# Altium footprint library ST封装.PcbLib: 1336 footprints (part 100 of 109)
Each footprint in its own frame and in the unit in brackets; x right, y up, seen from the top. Pads: shape width x height; smd on the part's side, far side on the other; paste and mask are expansions set on the pad; w line width, h text height; cw(c..) or ccw(c..) is an arc to the next point about the centre after c.
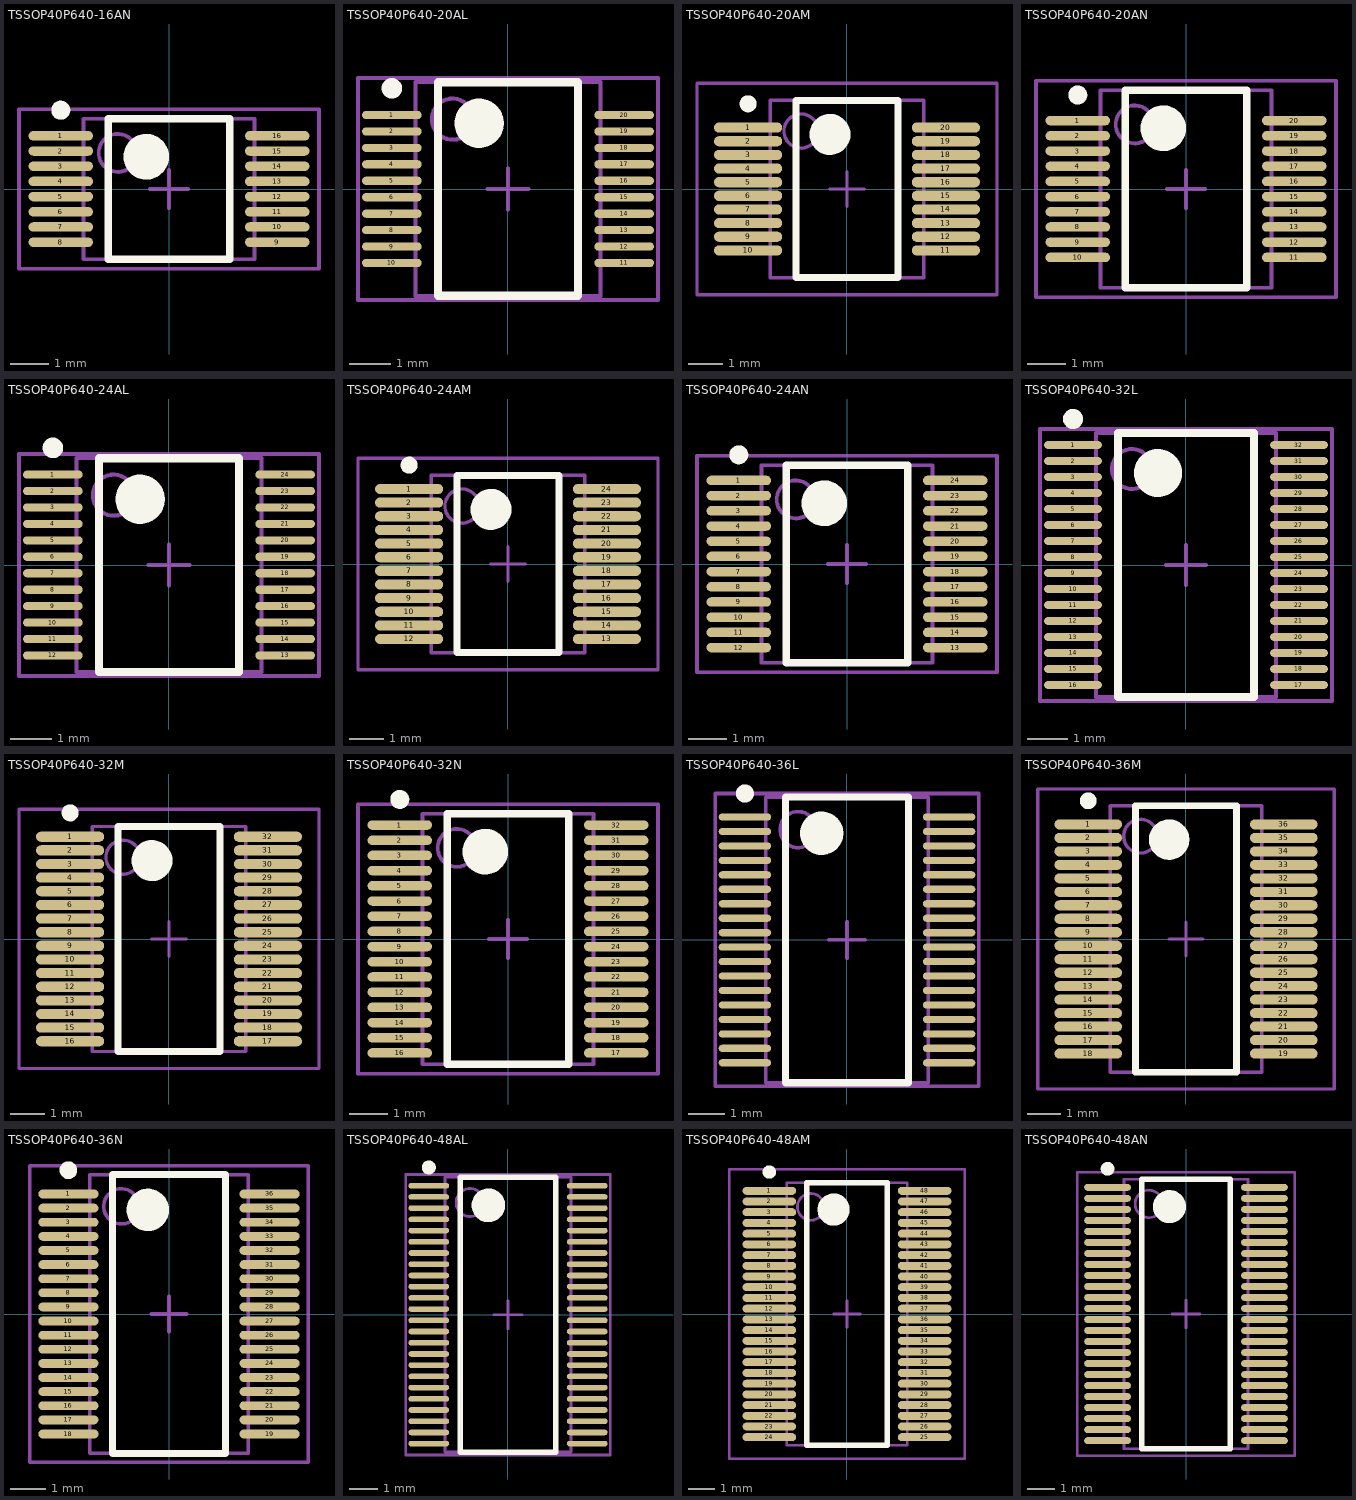
[diagram p99: the footprints below, top view; thin cyan lines are the x and y axes]

## TSSOP40P640-16AN [mm] "TSSOP, 16-Leads, Body 3.6x4.4mm, Pitch 0.4mm, IPC Medium Density"
height 1.2
pads (16):
  oval 1.7x0.25 smd: 1(-2.85,1.4) 2(-2.85,1) 3(-2.85,0.6) 4(-2.85,0.2) 5(-2.85,-0.2) 6(-2.85,-0.6) 7(-2.85,-1) 8(-2.85,-1.4) 9(2.85,-1.4) 10(2.85,-1) 11(2.85,-0.6) 12(2.85,-0.2) 13(2.85,0.2) 14(2.85,0.6) 15(2.85,1) 16(2.85,1.4)
Top Overlay:
  circle w0.6: c-0.6,0.85 r0.3
  circle w0.25: c-2.85,2.075 r0.125
  lines w0.2: -1.6,-1.85 1.6,-1.85 1.6,1.85 -1.6,1.85 -1.6,-1.85
Mechanical 13:
  circle w0.1: c-1.35,0.95 r0.5
  lines w0.1: -2.25,-1.85 2.25,-1.85 2.25,1.85 -2.25,1.85 -2.25,-1.85
Mechanical 15:
  lines w0.1: -0.5,0 0.5,0 ; 0,-0.5 0,0.5 ; -3.95,-2.1 3.95,-2.1 3.95,2.1 -3.95,2.1 -3.95,-2.1
3D body: height 1.2, standoff 0, extent -2.25,-1.85 2.25,1.85

## TSSOP40P640-20AL [mm] "TSSOP, 20-Leads, Body 5x4.4mm, Pitch 0.4mm, IPC High Density"
height 1.2
pads (20):
  oval 1.45x0.2 smd: 1(-2.825,1.8) 2(-2.825,1.4) 3(-2.825,1) 4(-2.825,0.6) 5(-2.825,0.2) 6(-2.825,-0.2) 7(-2.825,-0.6) 8(-2.825,-1) 9(-2.825,-1.4) 10(-2.825,-1.8) 11(2.825,-1.8) 12(2.825,-1.4) 13(2.825,-1) 14(2.825,-0.6) 15(2.825,-0.2) 16(2.825,0.2) 17(2.825,0.6) 18(2.825,1) 19(2.825,1.4) 20(2.825,1.8)
Top Overlay:
  circle w0.6: c-0.7,1.6 r0.3
  circle w0.25: c-2.825,2.45 r0.125
  lines w0.2: -1.7,-2.6 1.7,-2.6 1.7,2.6 -1.7,2.6 -1.7,-2.6
Mechanical 13:
  circle w0.1: c-1.35,1.7 r0.5
  lines w0.1: -2.25,-2.6 2.25,-2.6 2.25,2.6 -2.25,2.6 -2.25,-2.6
Mechanical 15:
  lines w0.1: -0.5,0 0.5,0 ; 0,-0.5 0,0.5 ; -3.65,-2.7 3.65,-2.7 3.65,2.7 -3.65,2.7 -3.65,-2.7
3D body: height 1.2, standoff 0, extent -2.25,-2.6 2.25,2.6

## TSSOP40P640-20AM [mm] "TSSOP, 20-Leads, Body 5x4.4mm, Pitch 0.4mm, IPC Low Density"
height 1.2
pads (20):
  oval 2x0.3 smd: 1(-2.9,1.8) 2(-2.9,1.4) 3(-2.9,1) 4(-2.9,0.6) 5(-2.9,0.2) 6(-2.9,-0.2) 7(-2.9,-0.6) 8(-2.9,-1) 9(-2.9,-1.4) 10(-2.9,-1.8) 11(2.9,-1.8) 12(2.9,-1.4) 13(2.9,-1) 14(2.9,-0.6) 15(2.9,-0.2) 16(2.9,0.2) 17(2.9,0.6) 18(2.9,1) 19(2.9,1.4) 20(2.9,1.8)
Top Overlay:
  circle w0.6: c-0.5,1.6 r0.3
  circle w0.25: c-2.9,2.5 r0.125
  lines w0.2: -1.5,-2.6 1.5,-2.6 1.5,2.6 -1.5,2.6 -1.5,-2.6
Mechanical 13:
  circle w0.1: c-1.35,1.7 r0.5
  lines w0.1: -2.25,-2.6 2.25,-2.6 2.25,2.6 -2.25,2.6 -2.25,-2.6
Mechanical 15:
  lines w0.1: -0.5,0 0.5,0 ; 0,-0.5 0,0.5 ; -4.4,-3.1 4.4,-3.1 4.4,3.1 -4.4,3.1 -4.4,-3.1
3D body: height 1.2, standoff 0, extent -2.25,-2.6 2.25,2.6

## TSSOP40P640-20AN [mm] "TSSOP, 20-Leads, Body 5x4.4mm, Pitch 0.4mm, IPC Medium Density"
height 1.2
pads (20):
  oval 1.7x0.25 smd: 1(-2.85,1.8) 2(-2.85,1.4) 3(-2.85,1) 4(-2.85,0.6) 5(-2.85,0.2) 6(-2.85,-0.2) 7(-2.85,-0.6) 8(-2.85,-1) 9(-2.85,-1.4) 10(-2.85,-1.8) 11(2.85,-1.8) 12(2.85,-1.4) 13(2.85,-1) 14(2.85,-0.6) 15(2.85,-0.2) 16(2.85,0.2) 17(2.85,0.6) 18(2.85,1) 19(2.85,1.4) 20(2.85,1.8)
Top Overlay:
  circle w0.6: c-0.6,1.6 r0.3
  circle w0.25: c-2.85,2.475 r0.125
  lines w0.2: -1.6,-2.6 1.6,-2.6 1.6,2.6 -1.6,2.6 -1.6,-2.6
Mechanical 13:
  circle w0.1: c-1.35,1.7 r0.5
  lines w0.1: -2.25,-2.6 2.25,-2.6 2.25,2.6 -2.25,2.6 -2.25,-2.6
Mechanical 15:
  lines w0.1: -0.5,0 0.5,0 ; 0,-0.5 0,0.5 ; -3.95,-2.85 3.95,-2.85 3.95,2.85 -3.95,2.85 -3.95,-2.85
3D body: height 1.2, standoff 0, extent -2.25,-2.6 2.25,2.6

## TSSOP40P640-24AL [mm] "TSSOP, 24-Leads, Body 5x4.4mm, Pitch 0.4mm, IPC High Density"
height 1.2
pads (24):
  oval 1.45x0.2 smd: 1(-2.825,2.2) 2(-2.825,1.8) 3(-2.825,1.4) 4(-2.825,1) 5(-2.825,0.6) 6(-2.825,0.2) 7(-2.825,-0.2) 8(-2.825,-0.6) 9(-2.825,-1) 10(-2.825,-1.4) 11(-2.825,-1.8) 12(-2.825,-2.2) 13(2.825,-2.2) 14(2.825,-1.8) 15(2.825,-1.4) 16(2.825,-1) 17(2.825,-0.6) 18(2.825,-0.2) 19(2.825,0.2) 20(2.825,0.6) 21(2.825,1) 22(2.825,1.4) 23(2.825,1.8) 24(2.825,2.2)
Top Overlay:
  circle w0.6: c-0.7,1.6 r0.3
  circle w0.25: c-2.825,2.85 r0.125
  lines w0.2: -1.7,-2.6 1.7,-2.6 1.7,2.6 -1.7,2.6 -1.7,-2.6
Mechanical 13:
  circle w0.1: c-1.35,1.7 r0.5
  lines w0.1: -2.25,-2.6 2.25,-2.6 2.25,2.6 -2.25,2.6 -2.25,-2.6
Mechanical 15:
  lines w0.1: -0.5,0 0.5,0 ; 0,-0.5 0,0.5 ; -3.65,-2.7 3.65,-2.7 3.65,2.7 -3.65,2.7 -3.65,-2.7
3D body: height 1.2, standoff 0, extent -2.25,-2.6 2.25,2.6

## TSSOP40P640-24AM [mm] "TSSOP, 24-Leads, Body 5x4.4mm, Pitch 0.4mm, IPC Low Density"
height 1.2
pads (24):
  oval 2x0.3 smd: 1(-2.9,2.2) 2(-2.9,1.8) 3(-2.9,1.4) 4(-2.9,1) 5(-2.9,0.6) 6(-2.9,0.2) 7(-2.9,-0.2) 8(-2.9,-0.6) 9(-2.9,-1) 10(-2.9,-1.4) 11(-2.9,-1.8) 12(-2.9,-2.2) 13(2.9,-2.2) 14(2.9,-1.8) 15(2.9,-1.4) 16(2.9,-1) 17(2.9,-0.6) 18(2.9,-0.2) 19(2.9,0.2) 20(2.9,0.6) 21(2.9,1) 22(2.9,1.4) 23(2.9,1.8) 24(2.9,2.2)
Top Overlay:
  circle w0.6: c-0.5,1.6 r0.3
  circle w0.25: c-2.9,2.9 r0.125
  lines w0.2: -1.5,-2.6 1.5,-2.6 1.5,2.6 -1.5,2.6 -1.5,-2.6
Mechanical 13:
  circle w0.1: c-1.35,1.7 r0.5
  lines w0.1: -2.25,-2.6 2.25,-2.6 2.25,2.6 -2.25,2.6 -2.25,-2.6
Mechanical 15:
  lines w0.1: -0.5,0 0.5,0 ; 0,-0.5 0,0.5 ; -4.4,-3.1 4.4,-3.1 4.4,3.1 -4.4,3.1 -4.4,-3.1
3D body: height 1.2, standoff 0, extent -2.25,-2.6 2.25,2.6

## TSSOP40P640-24AN [mm] "TSSOP, 24-Leads, Body 5x4.4mm, Pitch 0.4mm, IPC Medium Density"
height 1.2
pads (24):
  oval 1.7x0.25 smd: 1(-2.85,2.2) 2(-2.85,1.8) 3(-2.85,1.4) 4(-2.85,1) 5(-2.85,0.6) 6(-2.85,0.2) 7(-2.85,-0.2) 8(-2.85,-0.6) 9(-2.85,-1) 10(-2.85,-1.4) 11(-2.85,-1.8) 12(-2.85,-2.2) 13(2.85,-2.2) 14(2.85,-1.8) 15(2.85,-1.4) 16(2.85,-1) 17(2.85,-0.6) 18(2.85,-0.2) 19(2.85,0.2) 20(2.85,0.6) 21(2.85,1) 22(2.85,1.4) 23(2.85,1.8) 24(2.85,2.2)
Top Overlay:
  circle w0.6: c-0.6,1.6 r0.3
  circle w0.25: c-2.85,2.875 r0.125
  lines w0.2: -1.6,-2.6 1.6,-2.6 1.6,2.6 -1.6,2.6 -1.6,-2.6
Mechanical 13:
  circle w0.1: c-1.35,1.7 r0.5
  lines w0.1: -2.25,-2.6 2.25,-2.6 2.25,2.6 -2.25,2.6 -2.25,-2.6
Mechanical 15:
  lines w0.1: -0.5,0 0.5,0 ; 0,-0.5 0,0.5 ; -3.95,-2.85 3.95,-2.85 3.95,2.85 -3.95,2.85 -3.95,-2.85
3D body: height 1.2, standoff 0, extent -2.25,-2.6 2.25,2.6

## TSSOP40P640-32L [mm] "TSSOP, 32-Leads, Body 6.5x4.4mm, Pitch 0.4mm, IPC High Density"
height 1.2
pads (32):
  oval 1.45x0.2 smd: 1(-2.825,3) 2(-2.825,2.6) 3(-2.825,2.2) 4(-2.825,1.8) 5(-2.825,1.4) 6(-2.825,1) 7(-2.825,0.6) 8(-2.825,0.2) 9(-2.825,-0.2) 10(-2.825,-0.6) 11(-2.825,-1) 12(-2.825,-1.4) 13(-2.825,-1.8) 14(-2.825,-2.2) 15(-2.825,-2.6) 16(-2.825,-3) 17(2.825,-3) 18(2.825,-2.6) 19(2.825,-2.2) 20(2.825,-1.8) 21(2.825,-1.4) 22(2.825,-1) 23(2.825,-0.6) 24(2.825,-0.2) 25(2.825,0.2) 26(2.825,0.6) 27(2.825,1) 28(2.825,1.4) 29(2.825,1.8) 30(2.825,2.2) 31(2.825,2.6) 32(2.825,3)
Top Overlay:
  circle w0.25: c-2.825,3.65 r0.125
  circle w0.6: c-0.7,2.3 r0.3
  lines w0.2: -1.7,-3.3 -1.7,3.3 1.7,3.3 1.7,-3.3 -1.7,-3.3
Mechanical 13:
  circle w0.1: c-1.35,2.4 r0.5
  lines w0.1: -2.25,-3.3 -2.25,3.3 2.25,3.3 2.25,-3.3 -2.25,-3.3
Mechanical 15:
  lines w0.1: -0.5,0 0.5,0 ; 0,-0.5 0,0.5 ; -3.65,-3.4 -3.65,3.4 3.65,3.4 3.65,-3.4 -3.65,-3.4
3D body: height 1.2, standoff 0, extent -2.25,-3.3 2.25,3.3

## TSSOP40P640-32M [mm] "TSSOP, 32-Leads, Body 6.5x4.4mm, Pitch 0.4mm, IPC Low Density"
height 1.2
pads (32):
  oval 2x0.3 smd: 1(-2.9,3) 2(-2.9,2.6) 3(-2.9,2.2) 4(-2.9,1.8) 5(-2.9,1.4) 6(-2.9,1) 7(-2.9,0.6) 8(-2.9,0.2) 9(-2.9,-0.2) 10(-2.9,-0.6) 11(-2.9,-1) 12(-2.9,-1.4) 13(-2.9,-1.8) 14(-2.9,-2.2) 15(-2.9,-2.6) 16(-2.9,-3) 17(2.9,-3) 18(2.9,-2.6) 19(2.9,-2.2) 20(2.9,-1.8) 21(2.9,-1.4) 22(2.9,-1) 23(2.9,-0.6) 24(2.9,-0.2) 25(2.9,0.2) 26(2.9,0.6) 27(2.9,1) 28(2.9,1.4) 29(2.9,1.8) 30(2.9,2.2) 31(2.9,2.6) 32(2.9,3)
Top Overlay:
  circle w0.6: c-0.5,2.3 r0.3
  circle w0.25: c-2.9,3.7 r0.125
  lines w0.2: -1.5,-3.3 1.5,-3.3 1.5,3.3 -1.5,3.3 -1.5,-3.3
Mechanical 13:
  circle w0.1: c-1.35,2.4 r0.5
  lines w0.1: -2.25,-3.3 2.25,-3.3 2.25,3.3 -2.25,3.3 -2.25,-3.3
Mechanical 15:
  lines w0.1: -0.5,0 0.5,0 ; 0,-0.5 0,0.5 ; -4.4,-3.8 4.4,-3.8 4.4,3.8 -4.4,3.8 -4.4,-3.8
3D body: height 1.2, standoff 0, extent -2.25,-3.3 2.25,3.3

## TSSOP40P640-32N [mm] "TSSOP, 32-Leads, Body 6.5x4.4mm, Pitch 0.4mm, IPC Medium Density"
height 1.2
pads (32):
  oval 1.7x0.25 smd: 1(-2.85,3) 2(-2.85,2.6) 3(-2.85,2.2) 4(-2.85,1.8) 5(-2.85,1.4) 6(-2.85,1) 7(-2.85,0.6) 8(-2.85,0.2) 9(-2.85,-0.2) 10(-2.85,-0.6) 11(-2.85,-1) 12(-2.85,-1.4) 13(-2.85,-1.8) 14(-2.85,-2.2) 15(-2.85,-2.6) 16(-2.85,-3) 17(2.85,-3) 18(2.85,-2.6) 19(2.85,-2.2) 20(2.85,-1.8) 21(2.85,-1.4) 22(2.85,-1) 23(2.85,-0.6) 24(2.85,-0.2) 25(2.85,0.2) 26(2.85,0.6) 27(2.85,1) 28(2.85,1.4) 29(2.85,1.8) 30(2.85,2.2) 31(2.85,2.6) 32(2.85,3)
Top Overlay:
  circle w0.6: c-0.6,2.3 r0.3
  circle w0.25: c-2.85,3.675 r0.125
  lines w0.2: -1.6,-3.3 1.6,-3.3 1.6,3.3 -1.6,3.3 -1.6,-3.3
Mechanical 13:
  circle w0.1: c-1.35,2.4 r0.5
  lines w0.1: -2.25,-3.3 2.25,-3.3 2.25,3.3 -2.25,3.3 -2.25,-3.3
Mechanical 15:
  lines w0.1: -0.5,0 0.5,0 ; 0,-0.5 0,0.5 ; -3.95,-3.55 3.95,-3.55 3.95,3.55 -3.95,3.55 -3.95,-3.55
3D body: height 1.2, standoff 0, extent -2.25,-3.3 2.25,3.3

## TSSOP40P640-36L [mm] "TSSOP, 36-Leads, Body 7.8x4.4mm, Pitch 0.4mm, IPC High Density"
height 1.2
pads (36):
  oval 1.45x0.2 smd: 1(-2.825,3.4) 2(-2.825,3) 3(-2.825,2.6) 4(-2.825,2.2) 5(-2.825,1.8) 6(-2.825,1.4) 7(-2.825,1) 8(-2.825,0.6) 9(-2.825,0.2) 10(-2.825,-0.2) 11(-2.825,-0.6) 12(-2.825,-1) 13(-2.825,-1.4) 14(-2.825,-1.8) 15(-2.825,-2.2) 16(-2.825,-2.6) 17(-2.825,-3) 18(-2.825,-3.4) 19(2.825,-3.4) 20(2.825,-3) 21(2.825,-2.6) 22(2.825,-2.2) 23(2.825,-1.8) 24(2.825,-1.4) 25(2.825,-1) 26(2.825,-0.6) 27(2.825,-0.2) 28(2.825,0.2) 29(2.825,0.6) 30(2.825,1) 31(2.825,1.4) 32(2.825,1.8) 33(2.825,2.2) 34(2.825,2.6) 35(2.825,3) 36(2.825,3.4)
Top Overlay:
  circle w0.6: c-0.7,2.95 r0.3
  circle w0.25: c-2.825,4.05 r0.125
  lines w0.2: -1.7,-3.95 1.7,-3.95 1.7,3.95 -1.7,3.95 -1.7,-3.95
Mechanical 13:
  circle w0.1: c-1.35,3.05 r0.5
  lines w0.1: -2.25,-3.95 2.25,-3.95 2.25,3.95 -2.25,3.95 -2.25,-3.95
Mechanical 15:
  lines w0.1: -0.5,0 0.5,0 ; 0,-0.5 0,0.5 ; -3.65,-4.05 3.65,-4.05 3.65,4.05 -3.65,4.05 -3.65,-4.05
3D body: height 1.2, standoff 0, extent -2.25,-3.95 2.25,3.95

## TSSOP40P640-36M [mm] "TSSOP, 36-Leads, Body 7.8x4.4mm, Pitch 0.4mm, IPC Low Density"
height 1.2
pads (36):
  oval 2x0.3 smd: 1(-2.9,3.4) 2(-2.9,3) 3(-2.9,2.6) 4(-2.9,2.2) 5(-2.9,1.8) 6(-2.9,1.4) 7(-2.9,1) 8(-2.9,0.6) 9(-2.9,0.2) 10(-2.9,-0.2) 11(-2.9,-0.6) 12(-2.9,-1) 13(-2.9,-1.4) 14(-2.9,-1.8) 15(-2.9,-2.2) 16(-2.9,-2.6) 17(-2.9,-3) 18(-2.9,-3.4) 19(2.9,-3.4) 20(2.9,-3) 21(2.9,-2.6) 22(2.9,-2.2) 23(2.9,-1.8) 24(2.9,-1.4) 25(2.9,-1) 26(2.9,-0.6) 27(2.9,-0.2) 28(2.9,0.2) 29(2.9,0.6) 30(2.9,1) 31(2.9,1.4) 32(2.9,1.8) 33(2.9,2.2) 34(2.9,2.6) 35(2.9,3) 36(2.9,3.4)
Top Overlay:
  circle w0.6: c-0.5,2.95 r0.3
  circle w0.25: c-2.9,4.1 r0.125
  lines w0.2: -1.5,-3.95 1.5,-3.95 1.5,3.95 -1.5,3.95 -1.5,-3.95
Mechanical 13:
  circle w0.1: c-1.35,3.05 r0.5
  lines w0.1: -2.25,-3.95 2.25,-3.95 2.25,3.95 -2.25,3.95 -2.25,-3.95
Mechanical 15:
  lines w0.1: -0.5,0 0.5,0 ; 0,-0.5 0,0.5 ; -4.4,-4.45 4.4,-4.45 4.4,4.45 -4.4,4.45 -4.4,-4.45
3D body: height 1.2, standoff 0, extent -2.25,-3.95 2.25,3.95

## TSSOP40P640-36N [mm] "TSSOP, 36-Leads, Body 7.8x4.4mm, Pitch 0.4mm, IPC Medium Density"
height 1.2
pads (36):
  oval 1.7x0.25 smd: 1(-2.85,3.4) 2(-2.85,3) 3(-2.85,2.6) 4(-2.85,2.2) 5(-2.85,1.8) 6(-2.85,1.4) 7(-2.85,1) 8(-2.85,0.6) 9(-2.85,0.2) 10(-2.85,-0.2) 11(-2.85,-0.6) 12(-2.85,-1) 13(-2.85,-1.4) 14(-2.85,-1.8) 15(-2.85,-2.2) 16(-2.85,-2.6) 17(-2.85,-3) 18(-2.85,-3.4) 19(2.85,-3.4) 20(2.85,-3) 21(2.85,-2.6) 22(2.85,-2.2) 23(2.85,-1.8) 24(2.85,-1.4) 25(2.85,-1) 26(2.85,-0.6) 27(2.85,-0.2) 28(2.85,0.2) 29(2.85,0.6) 30(2.85,1) 31(2.85,1.4) 32(2.85,1.8) 33(2.85,2.2) 34(2.85,2.6) 35(2.85,3) 36(2.85,3.4)
Top Overlay:
  circle w0.6: c-0.6,2.95 r0.3
  circle w0.25: c-2.85,4.075 r0.125
  lines w0.2: -1.6,-3.95 1.6,-3.95 1.6,3.95 -1.6,3.95 -1.6,-3.95
Mechanical 13:
  circle w0.1: c-1.35,3.05 r0.5
  lines w0.1: -2.25,-3.95 2.25,-3.95 2.25,3.95 -2.25,3.95 -2.25,-3.95
Mechanical 15:
  lines w0.1: -0.5,0 0.5,0 ; 0,-0.5 0,0.5 ; -3.95,-4.2 3.95,-4.2 3.95,4.2 -3.95,4.2 -3.95,-4.2
3D body: height 1.2, standoff 0, extent -2.25,-3.95 2.25,3.95

## TSSOP40P640-48AL [mm] "TSSOP, 48-Leads, Body 9.7x4.4mm, Pitch 0.4mm, IPC High Density"
height 1.2
pads (48):
  oval 1.45x0.2 smd: 1(-2.825,4.6) 2(-2.825,4.2) 3(-2.825,3.8) 4(-2.825,3.4) 5(-2.825,3) 6(-2.825,2.6) 7(-2.825,2.2) 8(-2.825,1.8) 9(-2.825,1.4) 10(-2.825,1) 11(-2.825,0.6) 12(-2.825,0.2) 13(-2.825,-0.2) 14(-2.825,-0.6) 15(-2.825,-1) 16(-2.825,-1.4) 17(-2.825,-1.8) 18(-2.825,-2.2) 19(-2.825,-2.6) 20(-2.825,-3) 21(-2.825,-3.4) 22(-2.825,-3.8) 23(-2.825,-4.2) 24(-2.825,-4.6) 25(2.825,-4.6) 26(2.825,-4.2) 27(2.825,-3.8) 28(2.825,-3.4) 29(2.825,-3) 30(2.825,-2.6) 31(2.825,-2.2) 32(2.825,-1.8) 33(2.825,-1.4) 34(2.825,-1) 35(2.825,-0.6) 36(2.825,-0.2) 37(2.825,0.2) 38(2.825,0.6) 39(2.825,1) 40(2.825,1.4) 41(2.825,1.8) 42(2.825,2.2) 43(2.825,2.6) 44(2.825,3) 45(2.825,3.4) 46(2.825,3.8) 47(2.825,4.2) 48(2.825,4.6)
Top Overlay:
  circle w0.6: c-0.7,3.9 r0.3
  circle w0.25: c-2.825,5.25 r0.125
  lines w0.2: -1.7,-4.9 1.7,-4.9 1.7,4.9 -1.7,4.9 -1.7,-4.9
Mechanical 13:
  circle w0.1: c-1.35,4 r0.5
  lines w0.1: -2.25,-4.9 2.25,-4.9 2.25,4.9 -2.25,4.9 -2.25,-4.9
Mechanical 15:
  lines w0.1: -0.5,0 0.5,0 ; 0,-0.5 0,0.5 ; -3.65,-5 3.65,-5 3.65,5 -3.65,5 -3.65,-5
3D body: height 1.2, standoff 0, extent -2.25,-4.9 2.25,4.9

## TSSOP40P640-48AM [mm] "TSSOP, 48-Leads, Body 9.7x4.4mm, Pitch 0.4mm, IPC Low Density"
height 1.2
pads (48):
  oval 2x0.3 smd: 1(-2.9,4.6) 2(-2.9,4.2) 3(-2.9,3.8) 4(-2.9,3.4) 5(-2.9,3) 6(-2.9,2.6) 7(-2.9,2.2) 8(-2.9,1.8) 9(-2.9,1.4) 10(-2.9,1) 11(-2.9,0.6) 12(-2.9,0.2) 13(-2.9,-0.2) 14(-2.9,-0.6) 15(-2.9,-1) 16(-2.9,-1.4) 17(-2.9,-1.8) 18(-2.9,-2.2) 19(-2.9,-2.6) 20(-2.9,-3) 21(-2.9,-3.4) 22(-2.9,-3.8) 23(-2.9,-4.2) 24(-2.9,-4.6) 25(2.9,-4.6) 26(2.9,-4.2) 27(2.9,-3.8) 28(2.9,-3.4) 29(2.9,-3) 30(2.9,-2.6) 31(2.9,-2.2) 32(2.9,-1.8) 33(2.9,-1.4) 34(2.9,-1) 35(2.9,-0.6) 36(2.9,-0.2) 37(2.9,0.2) 38(2.9,0.6) 39(2.9,1) 40(2.9,1.4) 41(2.9,1.8) 42(2.9,2.2) 43(2.9,2.6) 44(2.9,3) 45(2.9,3.4) 46(2.9,3.8) 47(2.9,4.2) 48(2.9,4.6)
Top Overlay:
  circle w0.6: c-0.5,3.9 r0.3
  circle w0.25: c-2.9,5.3 r0.125
  lines w0.2: -1.5,-4.9 1.5,-4.9 1.5,4.9 -1.5,4.9 -1.5,-4.9
Mechanical 13:
  circle w0.1: c-1.35,4 r0.5
  lines w0.1: -2.25,-4.9 2.25,-4.9 2.25,4.9 -2.25,4.9 -2.25,-4.9
Mechanical 15:
  lines w0.1: -0.5,0 0.5,0 ; 0,-0.5 0,0.5 ; -4.4,-5.4 4.4,-5.4 4.4,5.4 -4.4,5.4 -4.4,-5.4
3D body: height 1.2, standoff 0, extent -2.25,-4.9 2.25,4.9

## TSSOP40P640-48AN [mm] "TSSOP, 48-Leads, Body 9.7x4.4mm, Pitch 0.4mm, IPC Medium Density"
height 1.2
pads (48):
  oval 1.7x0.25 smd: 1(-2.85,4.6) 2(-2.85,4.2) 3(-2.85,3.8) 4(-2.85,3.4) 5(-2.85,3) 6(-2.85,2.6) 7(-2.85,2.2) 8(-2.85,1.8) 9(-2.85,1.4) 10(-2.85,1) 11(-2.85,0.6) 12(-2.85,0.2) 13(-2.85,-0.2) 14(-2.85,-0.6) 15(-2.85,-1) 16(-2.85,-1.4) 17(-2.85,-1.8) 18(-2.85,-2.2) 19(-2.85,-2.6) 20(-2.85,-3) 21(-2.85,-3.4) 22(-2.85,-3.8) 23(-2.85,-4.2) 24(-2.85,-4.6) 25(2.85,-4.6) 26(2.85,-4.2) 27(2.85,-3.8) 28(2.85,-3.4) 29(2.85,-3) 30(2.85,-2.6) 31(2.85,-2.2) 32(2.85,-1.8) 33(2.85,-1.4) 34(2.85,-1) 35(2.85,-0.6) 36(2.85,-0.2) 37(2.85,0.2) 38(2.85,0.6) 39(2.85,1) 40(2.85,1.4) 41(2.85,1.8) 42(2.85,2.2) 43(2.85,2.6) 44(2.85,3) 45(2.85,3.4) 46(2.85,3.8) 47(2.85,4.2) 48(2.85,4.6)
Top Overlay:
  circle w0.6: c-0.6,3.9 r0.3
  circle w0.25: c-2.85,5.275 r0.125
  lines w0.2: -1.6,-4.9 1.6,-4.9 1.6,4.9 -1.6,4.9 -1.6,-4.9
Mechanical 13:
  circle w0.1: c-1.35,4 r0.5
  lines w0.1: -2.25,-4.9 2.25,-4.9 2.25,4.9 -2.25,4.9 -2.25,-4.9
Mechanical 15:
  lines w0.1: -0.5,0 0.5,0 ; 0,-0.5 0,0.5 ; -3.95,-5.15 3.95,-5.15 3.95,5.15 -3.95,5.15 -3.95,-5.15
3D body: height 1.2, standoff 0, extent -2.25,-4.9 2.25,4.9